# Altium integrated library SJ Switches.IntLib: 36 symbols
Pins are listed as number, name and electrical type; pins without a type are passive.

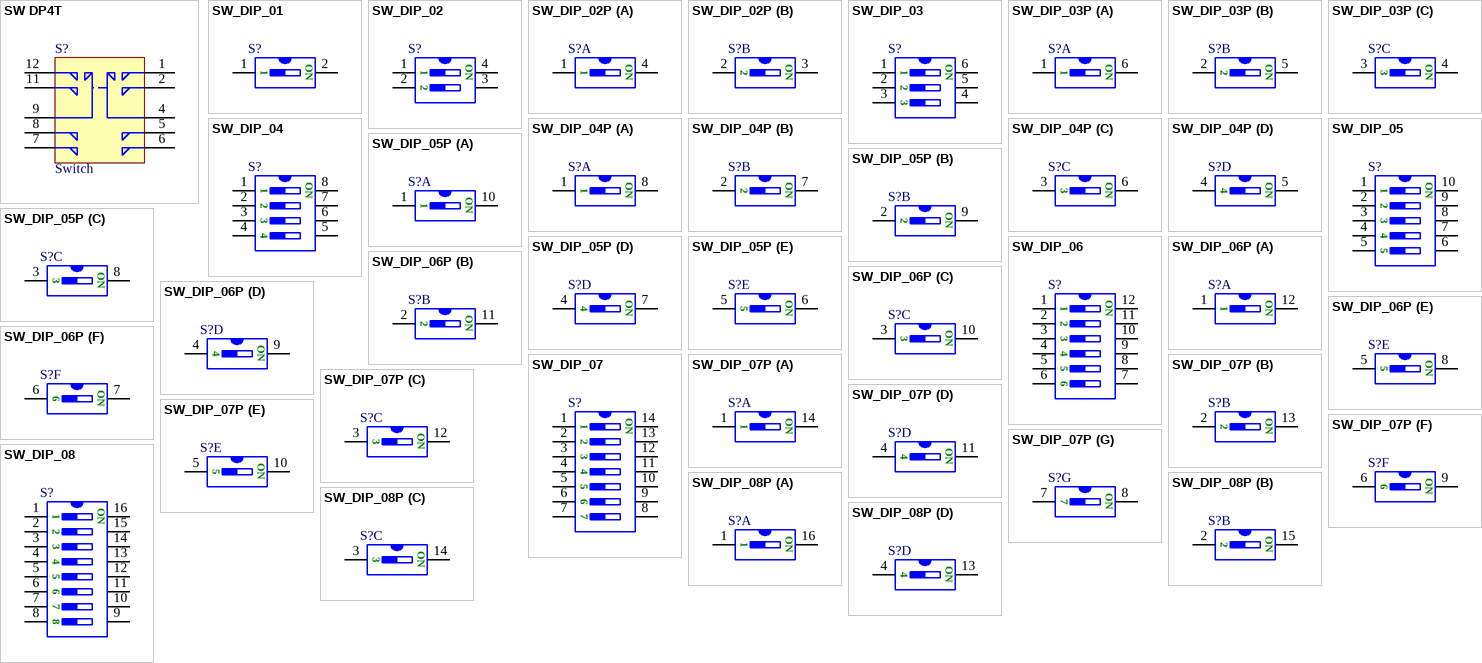
[diagram p0: symbols SW DP4T to SW_DIP_08P]

## SW DP4T
designator S?, comment Switch
DP4T Slide Switch; Company: SJ Libraries; Designer: Eng. Saeid Jorablo; Mounting Technology: Surface Mount\Through-Hole; ComponentLink1Description: Datasheet; Pin Count: 0; Update Date: 6/3/2012; Category: MISC; HelpURL: http://s3.picofile.com/file/7443264187/Coming_Soon_logo.gif
footprint SW DP4T
pins: 1, 2, 4, 5, 6, 7, 8, 9, 11, 12

## SW_DIP_01
designator S?  (value not drawn)
footprint THV_DIP_DS01
pins: 1, 2
1 alternate drawing of the same symbol
text: ON

## SW_DIP_02
designator S?  (value not drawn)
footprint SMV_DIP_CTS-219-02
pins: 1, 2, 3, 4
1 alternate drawing of the same symbol
text: ON

## SW_DIP_02P
designator S?  (value not drawn)
footprint SMV_DIP_CTS-219-02
part A pins: 1, 4
part B pins: 2, 3
1 alternate drawing of the same symbol
part A text: ON
part B text: ON

## SW_DIP_03
designator S?  (value not drawn)
footprint SMV_DIP_CTS-219-03
pins: 1, 2, 3, 4, 5, 6
1 alternate drawing of the same symbol
text: ON

## SW_DIP_03P
designator S?  (value not drawn)
footprint SMV_DIP_CTS-219-03
part A pins: 1, 6
part B pins: 2, 5
part C pins: 3, 4
1 alternate drawing of the same symbol
part A text: ON
part B text: ON
part C text: ON

## SW_DIP_04
designator S?  (value not drawn)
footprint SMV_DIP_CTS-219-04
pins: 1, 2, 3, 4, 5, 6, 7, 8
1 alternate drawing of the same symbol
text: ON

## SW_DIP_04P
designator S?  (value not drawn)
footprint SMV_DIP_CTS-219-04
part A pins: 1, 8
part B pins: 2, 7
part C pins: 3, 6
part D pins: 4, 5
1 alternate drawing of the same symbol
part A text: ON
part B text: ON
part C text: ON
part D text: ON

## SW_DIP_05
designator S?  (value not drawn)
footprint SMV_DIP_CTS-219-05
pins: 1, 2, 3, 4, 5, 6, 7, 8, 9, 10
1 alternate drawing of the same symbol
text: ON

## SW_DIP_05P
designator S?  (value not drawn)
footprint SMV_DIP_CTS-219-05
part A pins: 1, 10
part B pins: 2, 9
part C pins: 3, 8
part D pins: 4, 7
part E pins: 5, 6
1 alternate drawing of the same symbol
part A text: ON
part B text: ON
part C text: ON
part D text: ON
part E text: ON

## SW_DIP_06
designator S?  (value not drawn)
footprint SMV_DIP_CTS-219-06
pins: 1, 2, 3, 4, 5, 6, 7, 8, 9, 10, 11, 12
1 alternate drawing of the same symbol
text: ON

## SW_DIP_06P
designator S?  (value not drawn)
footprint SMV_DIP_CTS-219-06
part A pins: 1, 12
part B pins: 2, 11
part C pins: 3, 10
part D pins: 4, 9
part E pins: 5, 8
part F pins: 6, 7
1 alternate drawing of the same symbol
part A text: ON
part B text: ON
part C text: ON
part D text: ON
part E text: ON
part F text: ON

## SW_DIP_07
designator S?  (value not drawn)
footprint SMV_DIP_CTS-219-07
pins: 1, 2, 3, 4, 5, 6, 7, 8, 9, 10, 11, 12, 13, 14
1 alternate drawing of the same symbol
text: ON

## SW_DIP_07P
designator S?  (value not drawn)
footprint SMV_DIP_CTS-219-07
part A pins: 1, 14
part B pins: 2, 13
part C pins: 3, 12
part D pins: 4, 11
part E pins: 5, 10
part F pins: 6, 9
part G pins: 7, 8
1 alternate drawing of the same symbol
part A text: ON
part B text: ON
part C text: ON
part D text: ON
part E text: ON
part F text: ON
part G text: ON

## SW_DIP_08
designator S?  (value not drawn)
footprint SMV_DIP_CTS-219-08
pins: 1, 2, 3, 4, 5, 6, 7, 8, 9, 10, 11, 12, 13, 14, 15, 16
1 alternate drawing of the same symbol
text: ON

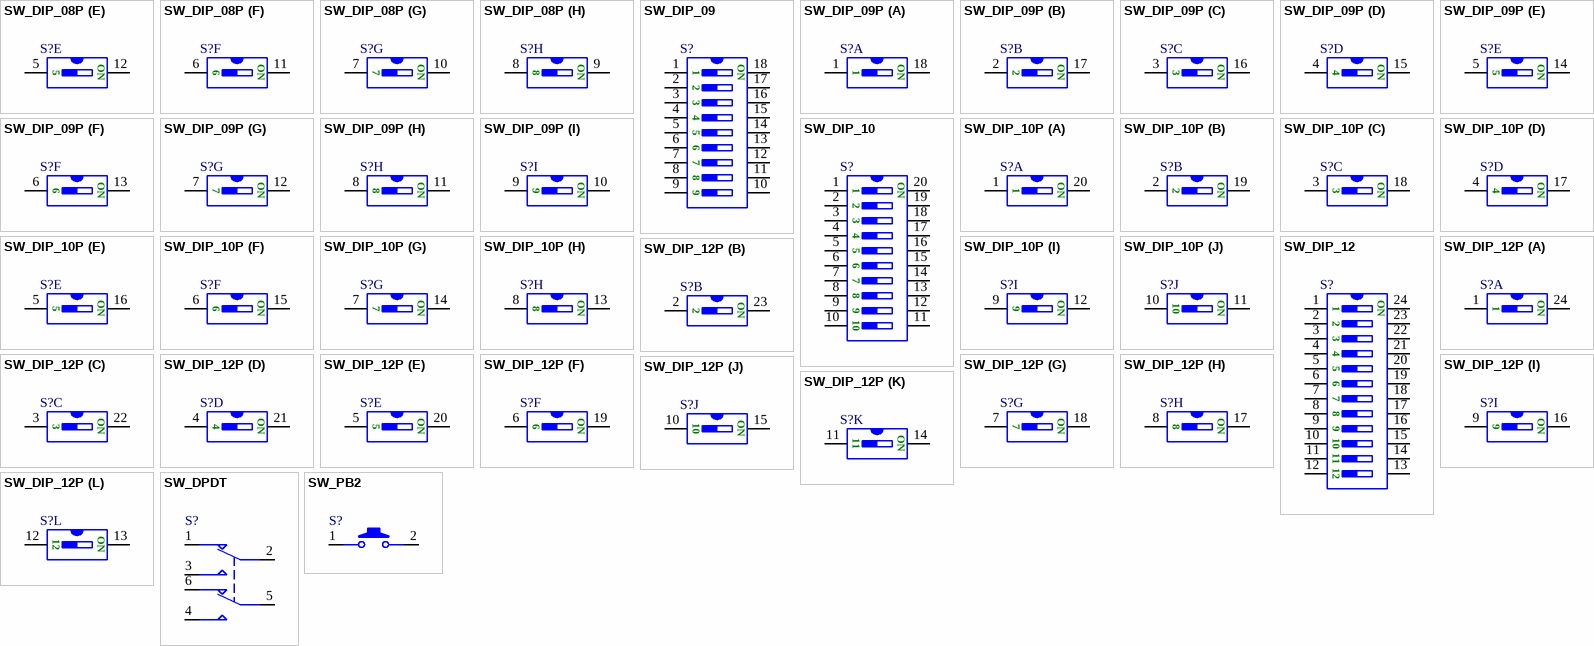
[diagram p1: symbols SW_DIP_08P to SW_PB2]

## SW_DIP_08P
designator S?  (value not drawn)
footprint SMV_DIP_CTS-219-08
part A pins: 1, 16
part B pins: 2, 15
part C pins: 3, 14
part D pins: 4, 13
part E pins: 5, 12
part F pins: 6, 11
part G pins: 7, 10
part H pins: 8, 9
1 alternate drawing of the same symbol
part A text: ON
part B text: ON
part C text: ON
part D text: ON
part E text: ON
part F text: ON
part G text: ON
part H text: ON

## SW_DIP_09
designator S?  (value not drawn)
footprint SMV_DIP_CTS-219-09
pins: 1, 2, 3, 4, 5, 6, 7, 8, 9, 10, 11, 12, 13, 14, 15, 16, 17, 18
1 alternate drawing of the same symbol
text: ON

## SW_DIP_09P
designator S?  (value not drawn)
footprint SMV_DIP_CTS-219-09
part A pins: 1, 18
part B pins: 2, 17
part C pins: 3, 16
part D pins: 4, 15
part E pins: 5, 14
part F pins: 6, 13
part G pins: 7, 12
part H pins: 8, 11
part I pins: 9, 10
1 alternate drawing of the same symbol
part A text: ON
part B text: ON
part C text: ON
part D text: ON
part E text: ON
part F text: ON
part G text: ON
part H text: ON
part I text: ON

## SW_DIP_10
designator S?  (value not drawn)
footprint SMV_DIP_CTS-219-10
pins: 1, 2, 3, 4, 5, 6, 7, 8, 9, 10, 11, 12, 13, 14, 15, 16, 17, 18, 19, 20
1 alternate drawing of the same symbol
text: ON

## SW_DIP_10P
designator S?  (value not drawn)
footprint SMV_DIP_CTS-219-10
part A pins: 1, 20
part B pins: 2, 19
part C pins: 3, 18
part D pins: 4, 17
part E pins: 5, 16
part F pins: 6, 15
part G pins: 7, 14
part H pins: 8, 13
part I pins: 9, 12
part J pins: 10, 11
1 alternate drawing of the same symbol
part A text: ON
part B text: ON
part C text: ON
part D text: ON
part E text: ON
part F text: ON
part G text: ON
part H text: ON
part I text: ON
part J text: ON

## SW_DIP_12
designator S?  (value not drawn)
footprint SMV_DIP_CTS-219-12
pins: 1, 2, 3, 4, 5, 6, 7, 8, 9, 10, 11, 12, 13, 14, 15, 16, 17, 18, 19, 20, 21, 22, 23, 24
1 alternate drawing of the same symbol
text: ON

## SW_DIP_12P
designator S?  (value not drawn)
footprint SMV_DIP_CTS-219-12
part A pins: 1, 24
part B pins: 2, 23
part C pins: 3, 22
part D pins: 4, 21
part E pins: 5, 20
part F pins: 6, 19
part G pins: 7, 18
part H pins: 8, 17
part I pins: 9, 16
part J pins: 10, 15
part K pins: 11, 14
part L pins: 12, 13
1 alternate drawing of the same symbol
part A text: ON
part B text: ON
part C text: ON
part D text: ON
part E text: ON
part F text: ON
part G text: ON
part H text: ON
part I text: ON
part J text: ON
part K text: ON
part L text: ON

## SW_DPDT
designator S?, comment Double Switch  (value not drawn)
DPDT Switch; Company: SJ Libraries; Designer: Eng. Saeid Jorablo; Mounting Technology: Surface Mount\Through-Hole; ComponentLink1Description: Datasheet; Pin Count: 0; Update Date: 6/3/2012; Category: MISC; HelpURL: http://s3.picofile.com/file/7443264187/Coming_Soon_logo.gif
footprint Switch - DPDT
footprint Switch DPDT - 500x495x1100x185 mil
pins: 1, 2, 3, 4, 5, 6

## SW_PB2
designator S?  (value not drawn)
2 Pin Push Button Switch; Company: SJ Libraries; Designer: Eng. Saeid Jorablo; Mounting Technology: Surface Mount\Through-Hole; ComponentLink1Description: Datasheet; Pin Count: 0; Update Date: 6/3/2012; Category: MISC; HelpURL: http://s3.picofile.com/file/7443264187/Coming_Soon_logo.gif
footprint SMD_ALPS_SKQMBBE010 (Vertical 6.0X3.5 mm Compact Type (SurfaceMount) SKQM Series ; Height 5.0 mm ; 50,000 Cycles ; 1.57N Force)
footprint THT_ALPS_SKHHLMA010 (Horizontal 6.0mm Square Type (Snap-in) SKHH Series; Stem length 3.85 mm ; 1,000,000 cycles ; 0.98N Force)
footprint THT_ALPS_SKHHLQA010 (Horizontal 6.0mm Square Type (Snap-in) SKHH Series; Stem length 8.35 mm ; 1,000,000 cycles ; 0.98N Force)
footprint THT_ALPS_SKHHLUA010 (Horizontal 6.0mm Square Type (Snap-in) SKHH Series; Stem length 5.85 mm ; 1,000,000 cycles ; 0.98N Force)
footprint THT_ALPS_SKHHNHA010 (Horizontal 6.0mm Square Type (Snap-in) SKHH Series; Stem length 15.85 mm ; 500,000 cycles ; 0.98N Force)
footprint THT_ALPS_SKHLAAA010 (Vertical 6.0x3.5mm Compact Type (Snap-in) SKHL Series ; Height 4.3 mm ; 50,000 cycles ; 0.98N Force)
footprint THT_ALPS_SKHLABA010 (Vertical 6.0x3.5mm Compact Type (Snap-in) SKHL Series ; Height 5.0 mm ; 50,000 cycles ; 0.98N Force)
footprint THT_ALPS_SKPDACD010 (Vertical 7.8 mm Square Type (Radial) SKPD Series; Height 5.5mm ; 100,000 cycles ; 2.45N Force)
footprint THT_ALPS_SKQKAJD010 (Vertical 6.6 mm Square Type (Radial) SKQK Series ; Height 9.5 mm ; 200,000 cycles ; 0.98N Force)
footprint THT_ALPS_SKRCACD010 (Vertical 9.0 mm Diameter Water-proof Type with Round Terminals (Radial) SKRC Series ; Height 13 mm ; 100,000 cycles ; 1.57N Force)
footprint THT_APLS_SKRGAAD010 (Vertical 6.2 mm Diameter Round Terminal Type (Radial) SKRG Series ; Height 4.3 mm ; 500,000 cycles ; 1.27N Force)
pins: 1 Button, 2
1 alternate drawing of the same symbol

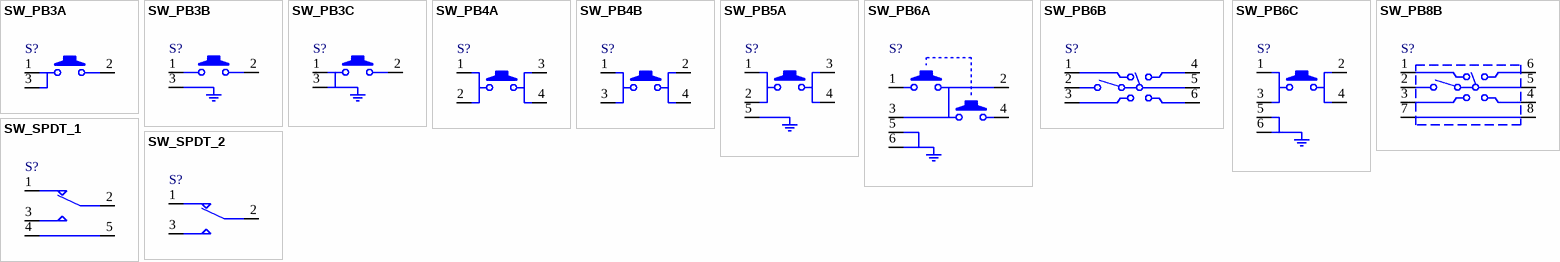
[diagram p2: symbols SW_PB3A to SW_SPDT_2]

## SW_PB3A
designator S?  (value not drawn)
3 Pin Push Button Switch; Company: SJ Libraries; Designer: Eng. Saeid Jorablo; Mounting Technology: Surface Mount\Through-Hole; ComponentLink1Description: Datasheet; Pin Count: 0; Update Date: 6/3/2012; Category: MISC; HelpURL: http://s3.picofile.com/file/7443264187/Coming_Soon_logo.gif
pins: 1 Button, 2, 3
1 alternate drawing of the same symbol

## SW_PB3B
designator S?  (value not drawn)
2 Pin Push Button Switch With GROUND Terminal; Company: SJ Libraries; Designer: Eng. Saeid Jorablo; Mounting Technology: Surface Mount\Through-Hole; ComponentLink1Description: Datasheet; Pin Count: 0; Update Date: 6/3/2012; Category: MISC; HelpURL: http://s3.picofile.com/file/7443264187/Coming_Soon_logo.gif
pins: 1 Button, 2, 3
1 alternate drawing of the same symbol

## SW_PB3C
designator S?  (value not drawn)
2 Pin Push Button Switch With GROUND Terminal; Company: SJ Libraries; Designer: Eng. Saeid Jorablo; Mounting Technology: Surface Mount\Through-Hole; ComponentLink1Description: Datasheet; Pin Count: 0; Update Date: 6/3/2012; Category: MISC; HelpURL: http://s3.picofile.com/file/7443264187/Coming_Soon_logo.gif
pins: 1 Button, 2, 3
1 alternate drawing of the same symbol

## SW_PB4A
designator S?  (value not drawn)
4 Pin Push Button Switch; Company: SJ Libraries; Designer: Eng. Saeid Jorablo; Mounting Technology: Surface Mount\Through-Hole; ComponentLink1Description: Datasheet; Pin Count: 0; Update Date: 6/3/2012; Category: MISC; HelpURL: http://s3.picofile.com/file/7443264187/Coming_Soon_logo.gif
footprint SMD_ALPS_SKQGAFE010 (Vertical 5.2 mm Square Low-profile Type (SurfaceMount) SKQG Series ; Height 1.5 mm ; 500,000 cycles ; 0.98N Force)
footprint THT_ALPS_SKHCBEA010 (12mm Square Type (Snap-in) SKHC Series ; Height 7.3 mm ; 1,000,000 cycles ; 1.27N Force)
footprint THT_ALPS_SKHHAJA010 (6.0mm Square Type (Snap-in) SKHH Series; 4.3 mm Height ; 1,000,000 cycles ; 0.98N Force)
footprint THT_ALPS_SKHHAKA010 (6.0mm Square Type (Snap-in) SKHH Series; 5.0 mm Height ; 1,000,000 cycles ; 0.98N Force)
footprint THT_ALPS_SKHHANA010 (6.0mm Square Type (Snap-in) SKHH Series; 9.5 mm Height ; 1,000,000 cycles ; 0.98N Force)
footprint THT_ALPS_SKHHBVA010 (6.0mm Square Type (Snap-in) SKHH Series; 7.0 mm Height ; 1,000,000 cycles ; 0.98N Force)
footprint THT_ALPS_SKHHCWA010 (6.0mm Square Type (Snap-in) SKHH Series , Joint Stem type ; 7.3 mm Height ; 1,000,000 cycles ; 0.98N Force)
footprint THT_ALPS_SKHHDHA010 (6.0mm Square Type (Snap-in) SKHH Series; 17.0 mm Height ; 500,000 cycles ; 0.98N Force)
footprint THT_ALPS_SKHHDTA010 (6.0mm Square Type (Snap-in) SKHH Series; 13.0 mm Height ; 1,000,000 cycles ; 0.98N Force)
footprint THT_ALPS_SKQEAAA010 (Vertical 12mm Square Long-life Type (Snap-in) SKQE Series ; Height 7.3 mm ; 10,000,000 cycles ; 1.57N Force)
footprint THT_ALPS_SKQEABA010 (Vertical 12mm Square Long-life Type (Snap-in) SKQE Series ; Height 4.3 mm ; 10,000,000 cycles)
pins: 1, 2, 3, 4
1 alternate drawing of the same symbol

## SW_PB4B
designator S?  (value not drawn)
4 Pin Push Button Switch; Company: SJ Libraries; Designer: Eng. Saeid Jorablo; Mounting Technology: Surface Mount\Through-Hole; ComponentLink1Description: Datasheet; Pin Count: 0; Update Date: 6/3/2012; Category: MISC; HelpURL: http://s3.picofile.com/file/7443264187/Coming_Soon_logo.gif
footprint SMD_ALPS_SKRBAGE010 (Vertical Low-profile Type (SurfaceMount) SKRB Series ; Height 0.55 mm ; 2,000,000 cycles ; 1.1N Force)
footprint SMD_ALPS_SKRMAAE010 (Vertical Low-profile Type (SurfaceMount) SKRM Series ; Height 0.4 mm ; 500,000 cycles ; 1.57N Force)
footprint SMD_ALPS_SKRWAEE030 (Vertical 3.7 mm Square Low-profile Type (Surface Mount) SKRW Series ; Height 0.35 mm ; 500,000 cycles ; 1.57N Force)
footprint SMD_ALPS_SKSHAAE010 (Vertical 3.3 x 2.9 mm Low-profile Type (Surface Mount) SKSH Series ; Height 0.379 mm ; 200,000 cycles ; 1.6N Force)
pins: 1, 2, 3, 4
1 alternate drawing of the same symbol

## SW_PB5A
designator S?  (value not drawn)
4 Pin Push Button Switch with GROUND Terminal; Company: SJ Libraries; Designer: Eng. Saeid Jorablo; Mounting Technology: Surface Mount\Through-Hole; ComponentLink1Description: Datasheet; Pin Count: 0; Update Date: 6/3/2012; Category: MISC; HelpURL: http://s3.picofile.com/file/7443264187/Coming_Soon_logo.gif
footprint SMD_ALPS_SKHMPXE010 (Vertical Surface mounting type for high density ; Height 3.1 mm ; <200,000 cycles ; 0.98 ~ 2.35 N Force)
footprint THT_ALPS_SKHHPJA010 (Vertical 6.0mm Square Type (Snap-in) SKHH Series With Ground Terminal; 4.3 mm Height ; 1,000,000 cycles ; 0.98N Force)
footprint THT_ALPS_SKHHPKA010 (Vertical 6.0mm Square Type (Snap-in) SKHH Series With Ground Terminal; 5.0 mm Height ; 1,000,000 cycles ; 0.98N Force)
footprint THT_ALPS_SKHHPNA010 (Vertical 6.0mm Square Type (Snap-in) SKHH Series With Ground Terminal; 9.5 mm Height ; 1,000,000 cycles ; 0.98N Force)
footprint THT_ALPS_SKHHQVA010 (Vertical 6.0mm Square Type (Snap-in) SKHH Series With Ground Terminal; 7.0 mm Height ; 1,000,000 cycles ; 0.98N Force)
pins: 1, 2, 3, 4, 5
1 alternate drawing of the same symbol

## SW_PB6A
designator S?  (value not drawn)
6 Pin Push Button Switch; Company: SJ Libraries; Designer: Eng. Saeid Jorablo; Mounting Technology: Surface Mount\Through-Hole; ComponentLink1Description: Datasheet; Pin Count: 0; Update Date: 6/3/2012; Category: MISC; HelpURL: http://s3.picofile.com/file/7443264187/Coming_Soon_logo.gif
pins: 1, 2, 3, 4, 5, 6
1 alternate drawing of the same symbol

## SW_PB6B
designator S?  (value not drawn)
6 Pin Push Button Switch; Company: SJ Libraries; Designer: Eng. Saeid Jorablo; Mounting Technology: Surface Mount\Through-Hole; ComponentLink1Description: Datasheet; Pin Count: 0; Update Date: 6/3/2012; Category: MISC; HelpURL: http://s3.picofile.com/file/7443264187/Coming_Soon_logo.gif
pins: 1, 2, 3, 4, 5, 6

## SW_PB6C
designator S?  (value not drawn)
4 Pin Push Button Switch with GROUND Terminal; Company: SJ Libraries; Designer: Eng. Saeid Jorablo; Mounting Technology: Surface Mount\Through-Hole; ComponentLink1Description: Datasheet; Pin Count: 0; Update Date: 6/3/2012; Category: MISC; HelpURL: http://s3.picofile.com/file/7443264187/Coming_Soon_logo.gif
footprint SMD_ALPS_SKSGAAE010
footprint SMD_ALPS_SKSGPAE010 (Vertical 3.0x2.7 mm Compact High Operating Force Type (SurfaceMount) SKSG Series with GND Terminal; Height 1.4 mm ; 200,000 cycles ; 4N force)
pins: 1, 2, 3, 4, 5, 6
1 alternate drawing of the same symbol

## SW_PB8B
designator S?, comment SW_PB8D  (value not drawn)
8 Pin Push Button Directional Switch; Company: SJ Libraries; Designer: Eng. Saeid Jorablo; Mounting Technology: Surface Mount\Through-Hole; ComponentLink1Description: Datasheet; Pin Count: 0; Update Date: 6/3/2012; Category: MISC; HelpURL: http://s3.picofile.com/file/7443264187/Coming_Soon_logo.gif
footprint SMD_PB8_JOY (8Pin Joystick Push Button)
pins: 1, 2, 3, 4, 5, 6, 7, 8

## SW_SPDT_1
designator S?  (value not drawn)
Toggle SPDT Switch with Body Hole; Company: SJ Libraries; Designer: Eng. Saeid Jorablo; Mounting Technology: Surface Mount\Through-Hole; ComponentLink1Description: Datasheet; Pin Count: 0; Update Date: 6/3/2012; Category: MISC; HelpURL: http://s3.picofile.com/file/7443264187/Coming_Soon_logo.gif
footprint SW SPDT Subminiator (Subminiator SPDT switch)
pins: 1, 2, 3, 4 (power), 5 (power)

## SW_SPDT_2
designator S?  (value not drawn)
Toggle SPDT Switch without Body Hole; Company: SJ Libraries; Designer: Eng. Saeid Jorablo; Mounting Technology: Surface Mount\Through-Hole; ComponentLink1Description: Datasheet; Pin Count: 0; Update Date: 6/3/2012; Category: MISC; HelpURL: http://s3.picofile.com/file/7443264187/Coming_Soon_logo.gif
footprint Switch SPDT - 500x270x1100x185 mil
footprint Switch SPDT - 500x270x1100x185 mil - Right Angle
footprint SW SPDT- Horizontal
pins: 1, 2, 3